# Altium footprint library ThanhNT.PcbLib: 579 footprints (part 17 of 37)
Each footprint in its own frame and in the unit in brackets; x right, y up, seen from the top. Pads: shape width x height; smd on the part's side, far side on the other; paste and mask are expansions set on the pad; w line width, h text height; cw(c..) or ccw(c..) is an arc to the next point about the centre after c.
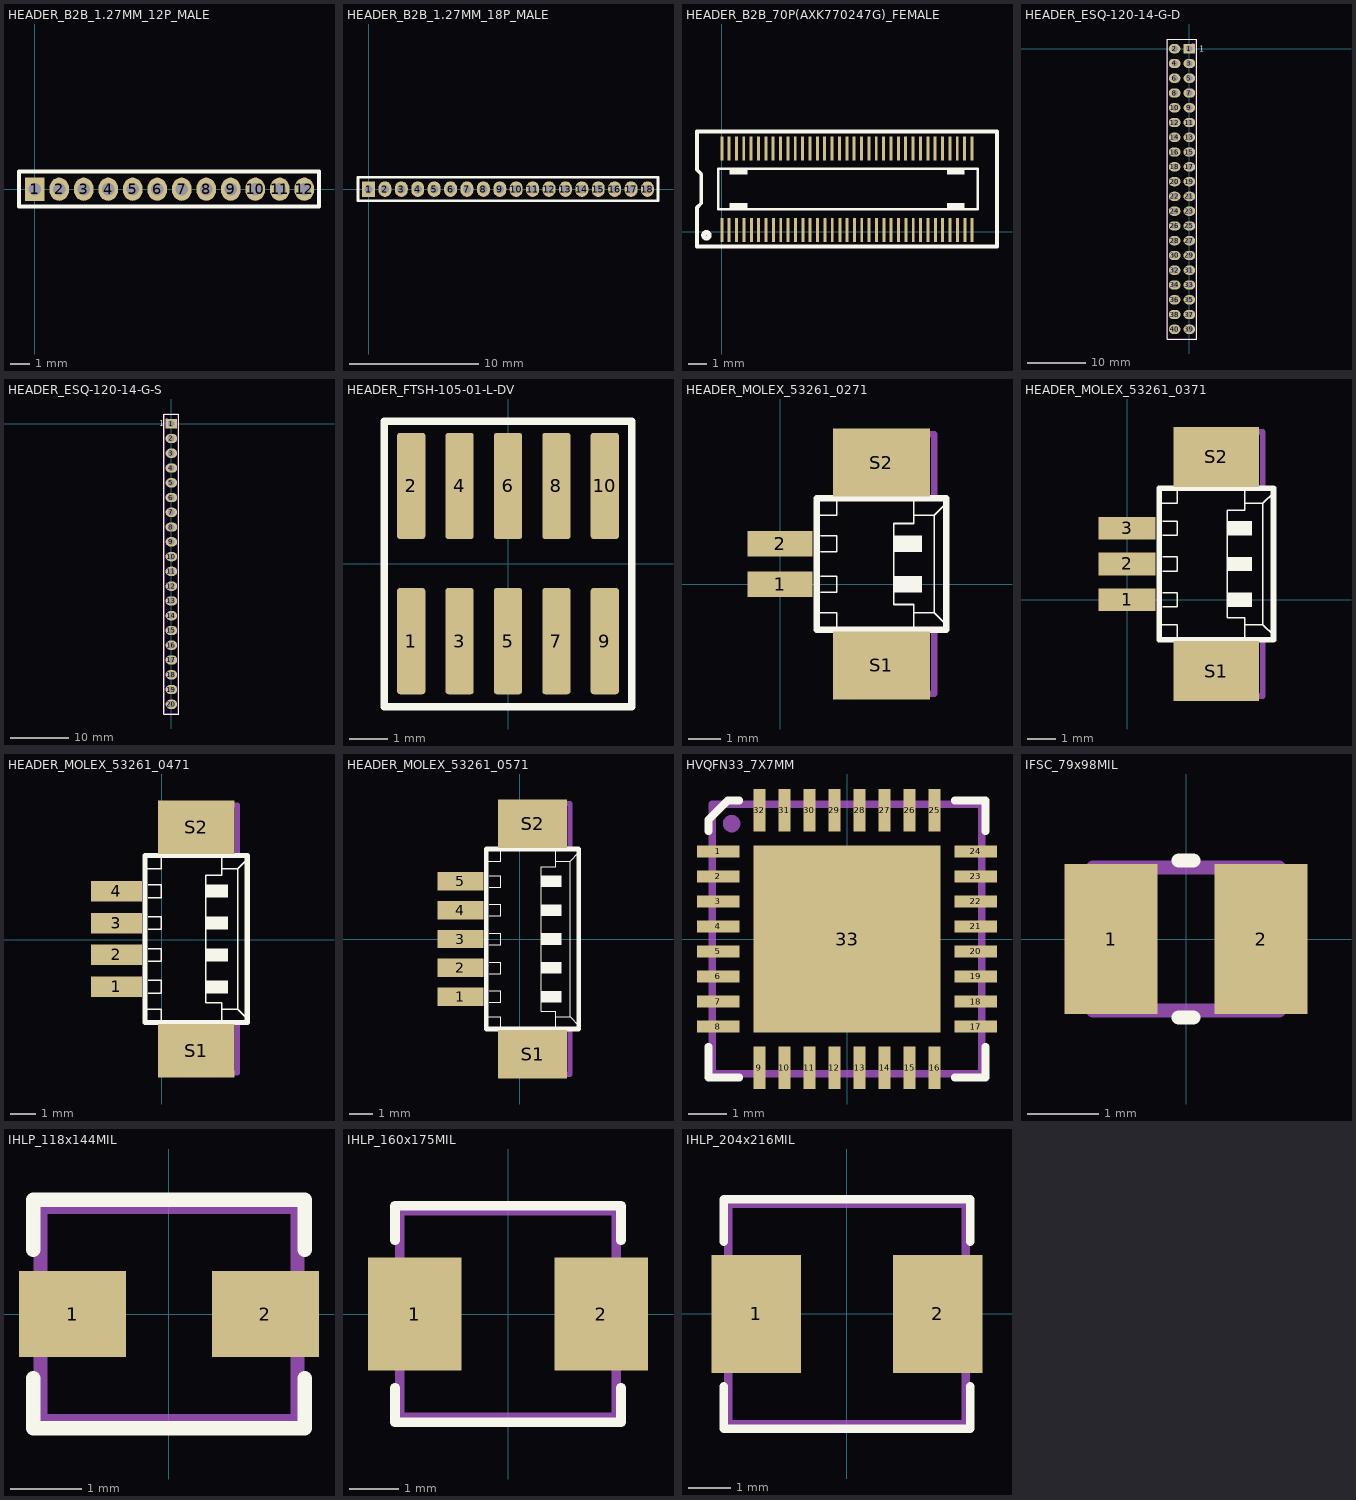
[diagram p16: the footprints below, top view; thin cyan lines are the x and y axes]

## HEADER_B2B_1.27MM_12P_MALE [mm]
pads (12):
  rect 1x1.2 hole 0.65: 1(0,0)
  oval 1x1.2 hole 0.65: 2(1.27,0) 3(2.54,0) 4(3.81,0) 5(5.08,0) 6(6.35,0) 7(7.62,0) 8(8.89,0) 9(10.16,0) 10(11.43,0) 11(12.7,0) 12(13.97,0)
Top Overlay:
  lines w0.2: -0.813,-0.889 14.732,-0.889 14.732,0.914 -0.813,0.914 -0.813,-0.889

## HEADER_B2B_1.27MM_18P_MALE [mm]
pads (18):
  rect 1x1.2 hole 0.65: 1(0,0)
  oval 1x1.2 hole 0.65: 2(1.27,0) 3(2.54,0) 4(3.81,0) 5(5.08,0) 6(6.35,0) 7(7.62,0) 8(8.89,0) 9(10.16,0) 10(11.43,0) 11(12.7,0) 12(13.97,0) 13(15.24,0) 14(16.51,0) 15(17.78,0) 16(19.05,0) 17(20.32,0) 18(21.59,0)
Top Overlay:
  lines w0.2: -0.813,-0.889 -0.813,0.914 22.403,0.914 22.403,-0.889 -0.813,-0.889

## HEADER_B2B_70P(AXK770247G)_FEMALE [mm] "Board to Board Connector (AXK770247G)"
pads (70):
  rect 0.16x1.3 smd: 1(0,0.076) 2(0.4,0.076) 3(0.8,0.076) 4(1.2,0.076) 5(1.6,0.076) 6(2,0.076) 7(2.4,0.076) 8(2.8,0.076) 9(3.2,0.076) 10(3.6,0.076) 11(4,0.076) 12(4.4,0.076) 13(4.8,0.076) 13(5.2,0.076) 15(5.6,0.076) 16(6,0.076) 17(6.42,0.086) 18(6.8,0.076) 19(7.2,0.076) 20(7.6,0.076) 21(8,0.076) 22(8.4,0.076) 23(8.8,0.076) 24(9.2,0.076) 25(9.6,0.076) 26(10,0.076) 27(10.4,0.076) 28(10.8,0.076) 29(11.2,0.076) 30(11.6,0.076) 31(12,0.076) 32(12.4,0.076) 33(12.8,0.076) 34(13.2,0.076) 35(13.6,0.076) 36(13.6,4.516) 37(13.189,4.516) 38(12.789,4.516) 39(12.389,4.516) 40(11.989,4.516) 41(11.589,4.516) 42(11.189,4.516) 43(10.789,4.516) 44(10.389,4.516) 45(9.989,4.516) 46(9.589,4.516) 47(9.189,4.516) 48(8.789,4.516) 49(8.389,4.516) 50(7.989,4.516) 51(7.589,4.516) 52(7.189,4.516) 53(6.789,4.516) 54(6.389,4.516) 55(5.989,4.516) 56(5.589,4.516) 57(5.189,4.516) 58(4.789,4.516) 59(4.389,4.516) 60(3.989,4.516) 61(3.589,4.516) 62(3.189,4.516) 63(2.789,4.516) 64(2.389,4.516) 65(1.989,4.516) 66(1.589,4.516) 67(1.189,4.516) 68(0.789,4.516) 69(0.389,4.516) 70(0,4.516)
Top Overlay:
  circle w0.254: c-0.838,-0.203 r0.156
  rectangle: 0.42,3.096 1.39,3.406
  rectangle: 0.42,1.246 1.39,1.556
  rectangle: 12.22,3.096 13.19,3.406
  rectangle: 12.22,1.246 13.19,1.556
  lines w0.127: -0.2,1.206 13.9,1.206 13.9,3.416 -0.2,3.416 -0.2,1.206
  lines w0.2: -1.35,-0.813 -1.35,1.301 -1.12,1.531 -1.12,3.121 -1.35,3.351 -1.35,5.436 14.95,5.436 14.95,-0.813 -1.35,-0.813
3D body "axk770247.stp": height 1.92, standoff 0, extent -1.343,-0.239 14.957,4.861

## HEADER_ESQ-120-14-G-D [mm]
pads (40):
  rect 2x1.6 hole 1.1: 1(0,0)
  oval 2x1.6 hole 1.1: 2(-2.54,0) 3(0,-2.54) 4(-2.54,-2.54) 5(0,-5.08) 6(-2.54,-5.08) 7(0,-7.62) 8(-2.54,-7.62) 9(0,-10.16) 10(-2.54,-10.16) 11(0,-12.7) 12(-2.54,-12.7) 13(0,-15.24) 14(-2.54,-15.24) 15(0,-17.78) 16(-2.54,-17.78) 17(0,-20.32) 18(-2.54,-20.32) 19(0,-22.86) 20(-2.54,-22.86) 21(0,-25.4) 22(-2.54,-25.4) 23(0,-27.94) 24(-2.54,-27.94) 25(0,-30.48) 26(-2.54,-30.48) 27(0,-33.02) 28(-2.54,-33.02) 29(0,-35.56) 30(-2.54,-35.56) 31(0,-38.1) 32(-2.54,-38.1) 33(0,-40.64) 34(-2.54,-40.64) 35(0,-43.18) 36(-2.54,-43.18) 37(0,-45.72) 38(-2.54,-45.72) 39(0,-48.26) 40(-2.54,-48.26)
Top Overlay:
  lines w0.2: -3.84,-49.93 -3.84,1.67 1.3,1.67 1.3,-49.93 -3.84,-49.93
  text "1" at 1.65,-0.5 h1.02
Bottom Overlay:
  lines w0.2: -3.84,-49.93 1.3,-49.93 1.3,1.67 -3.84,1.67 -3.84,-49.93
  text "1" at 2,-0.41 h1.02
Mechanical 16:
  circle w0.5: c0.6,0.6 r0.1
  lines w0.2: -3.74,-49.85 1.2,-49.85 1.2,1.59 -3.74,1.59 -3.74,-49.85
Mechanical 29:
  text ".Designator" at -0.6,-25.6 h1.52
3D body "ESQ-120-14-G-D.stp": height 12.11, standoff -11.13, extent -3.81,-49.784 1.27,1.524

## HEADER_ESQ-120-14-G-S [mm]
pads (20):
  rect 2x1.6 hole 1.1: 1(0,0)
  oval 2x1.6 hole 1.1: 2(0,-2.54) 3(0,-5.08) 4(0,-7.62) 5(0,-10.16) 6(0,-12.7) 7(0,-15.24) 8(0,-17.78) 9(0,-20.32) 10(0,-22.86) 11(0,-25.4) 12(0,-27.94) 13(0,-30.48) 14(0,-33.02) 15(0,-35.56) 16(0,-38.1) 17(0,-40.64) 18(0,-43.18) 19(0,-45.72) 20(0,-48.26)
Top Overlay:
  lines w0.2: -1.3,-49.93 -1.3,1.67 1.3,1.67 1.3,-49.93 -1.3,-49.93
  text "1" at -2.12,-0.4 h1.02
Bottom Overlay:
  lines w0.2: -1.3,-49.93 1.3,-49.93 1.3,1.67 -1.3,1.67 -1.3,-49.93
  text "1" at -0.82,2.2 h1.02
Mechanical 16:
  circle w0.254: c-0.8,0.79 r0.1
  lines w0.254: -1.2,-49.85 -1.2,1.59 1.2,1.59 1.2,-49.85 -1.2,-49.85
Mechanical 29:
  text ".Designator" at 0.78,-25.4 h1.52
3D body "ESQ-120-14-G-S.stp": height 11.11, standoff -12.13, extent -1.274,-49.784 1.266,1.524

## HEADER_FTSH-105-01-L-DV [mm] "FTSH-105-01-L-DV"
height 6
pads (10):
  rrect20% 0.74x2.79 smd: 1(-2.54,-2.035) 2(-2.54,2.035) 3(-1.27,-2.035) 4(-1.27,2.035) 5(0,-2.035) 6(0,2.035) 7(1.27,-2.035) 8(1.27,2.035) 9(2.54,-2.035) 10(2.54,2.035)
Top Overlay:
  lines w0.2: -3.251,-3.759 -3.251,3.734 3.251,3.734 3.251,-3.759 -3.251,-3.759
3D body "FTSH-105-01-L-DV.step": height 6.01, standoff 0.04, extent -3.175,-2.921 3.175,2.921

## HEADER_MOLEX_10P (NOTOK) [mm]
3D body "SW3dPS-Molex - 15-91-0100 (Pin Header 2.54mm 10 Pin).STEP": height 3.5, standoff -3.5, extent 46.279,64.559 58.979,74.219

## HEADER_MOLEX_53261_0271 [mm]
pads (4):
  rect 2x0.8 smd: 1(0,0) 2(0,1.25)
  rect 3x2.1 smd: S1(3.125,-2.5) S2(3.125,3.75)
Top Overlay:
  region: 3.5,0.25 3.5,-0.25 4.375,-0.25 4.375,0.25
  region: 3.5,1.5 3.5,1 4.375,1 4.375,1.5
  lines w0.051: 1.125,-0.875 1.75,-0.875 1.75,-1.375 ; 1.125,2.125 1.75,2.125 1.75,2.625 ; 1.25,-0.25 1.75,-0.25 1.75,0.25 1.25,0.25 ; 1.25,1 1.75,1 1.75,1.5 1.25,1.5 ; 4.125,-1.375 4.125,-0.875 ; 4.125,2.625 4.125,2.125 ; 5.125,-1.25 4.75,-0.875 ; 5.125,2.5 4.75,2.125 ; 4.125,-0.875 4.75,-0.875 ; 4.125,-0.875 4.125,-0.625 3.5,-0.625 3.5,1.875 4.125,1.875 4.125,2.125 ; 4.125,2.125 4.75,2.125 ; 4.75,-0.875 4.75,2.125
  lines w0.203: 1.125,-1.4 5.125,-1.4 5.125,-1.25 5.125,2.5 5.125,2.65 1.125,2.65 1.125,2.125 1.125,-0.875 1.125,-1.4
Mechanical 16:
  lines w0.203: 1.75,-1.5 1.75,-3.375 4.75,-3.375 4.75,-1.5 ; 1.75,2.75 1.75,4.625 4.75,4.625 4.75,2.75
  text "1" at 2.25,-1.875 h2.99
3D body "User Library-molex 5326153261-0271.STEP": height 3.5, standoff 0, extent -0.152,-3.228 5.048,4.422

## HEADER_MOLEX_53261_0371 [mm]
pads (5):
  rect 2x0.8 smd: 1(0,0) 2(0,1.25) 3(0,2.5)
  rect 3x2.1 smd: S1(3.125,-2.5) S2(3.125,5)
Top Overlay:
  region: 3.5,2.75 3.5,2.25 4.375,2.25 4.375,2.75
  region: 3.5,1.5 3.5,1 4.375,1 4.375,1.5
  region: 3.5,0.25 3.5,-0.25 4.375,-0.25 4.375,0.25
  lines w0.051: 1.125,-0.875 1.75,-0.875 1.75,-1.375 ; 1.125,3.375 1.75,3.375 1.75,3.875 ; 1.25,-0.25 1.75,-0.25 1.75,0.25 1.25,0.25 ; 1.25,1 1.75,1 1.75,1.5 1.25,1.5 ; 1.25,2.25 1.75,2.25 1.75,2.75 1.25,2.75 ; 4.125,-1.375 4.125,-0.875 ; 4.125,3.875 4.125,3.375 ; 5.125,-1.25 4.75,-0.875 ; 5.125,3.75 4.75,3.375 ; 4.125,-0.875 4.125,-0.625 3.5,-0.625 3.5,3.125 4.125,3.125 4.125,3.375 ; 4.125,-0.875 4.75,-0.875 ; 4.125,3.375 4.75,3.375 ; 4.75,-0.875 4.75,3.375
  lines w0.203: 1.125,-1.4 1.125,-0.875 1.125,3.375 1.125,3.9 5.125,3.9 5.125,3.75 5.125,-1.25 5.125,-1.4 1.125,-1.4
Mechanical 16:
  lines w0.203: 1.75,-1.5 1.75,-3.375 4.75,-3.375 4.75,-1.5 ; 1.75,4 1.75,5.875 4.75,5.875 4.75,4
  text "1" at 2.25,-1.875 h2.99
3D body "User Library-molex 5326153261-0371.STEP": height 3.5, standoff 0, extent -0.086,-3.205 5.114,5.695

## HEADER_MOLEX_53261_0471 [mm]
pads (6):
  rect 2x0.8 smd: 1(-1.782,-1.844) 2(-1.782,-0.594) 3(-1.782,0.656) 4(-1.782,1.906)
  rect 3x2.1 smd: S1(1.343,-4.344) S2(1.343,4.406)
Top Overlay:
  region: 1.718,-1.594 1.718,-2.094 2.593,-2.094 2.593,-1.594
  region: 1.718,-0.344 1.718,-0.844 2.593,-0.844 2.593,-0.344
  region: 1.718,0.906 1.718,0.406 2.593,0.406 2.593,0.906
  region: 1.718,2.156 1.718,1.656 2.593,1.656 2.593,2.156
  lines w0.051: -0.657,-2.719 -0.032,-2.719 -0.032,-3.219 ; -0.657,2.781 -0.032,2.781 -0.032,3.281 ; -0.532,-2.094 -0.032,-2.094 -0.032,-1.594 -0.532,-1.594 ; -0.532,-0.844 -0.032,-0.844 -0.032,-0.344 -0.532,-0.344 ; -0.532,0.406 -0.032,0.406 -0.032,0.906 -0.532,0.906 ; -0.532,1.656 -0.032,1.656 -0.032,2.156 -0.532,2.156 ; 2.343,-3.219 2.343,-2.719 ; 2.343,3.281 2.343,2.781 ; 3.343,-3.094 2.968,-2.719 ; 3.343,3.156 2.968,2.781 ; 2.343,-2.719 2.968,-2.719 ; 2.343,-2.719 2.343,-2.469 1.718,-2.469 1.718,2.531 2.343,2.531 2.343,2.781 ; 2.343,2.781 2.968,2.781 ; 2.968,-2.719 2.968,2.781
  lines w0.203: -0.657,-3.244 3.343,-3.244 3.343,-3.094 3.343,3.156 3.343,3.306 -0.657,3.306 -0.657,2.781 -0.657,-2.719 -0.657,-3.244
Mechanical 16:
  lines w0.203: -0.032,-3.344 -0.032,-5.219 2.968,-5.219 2.968,-3.344 ; -0.032,3.406 -0.032,5.281 2.968,5.281 2.968,3.406
  text "1" at 0.468,-3.719 h2.99
3D body "User Library-molex 5326153261-0471.STEP": height 3.5, standoff 0, extent -1.916,-5.064 3.284,5.086

## HEADER_MOLEX_53261_0571 [mm]
pads (7):
  rect 2x0.8 smd: 1(-2.564,-2.491) 2(-2.564,-1.24) 3(-2.564,0.01) 4(-2.564,1.26) 5(-2.564,2.51)
  rect 3x2.1 smd: S1(0.561,-4.99) S2(0.561,5.01)
Top Overlay:
  region: 0.936,2.76 0.936,2.26 1.811,2.26 1.811,2.76
  region: 0.936,1.51 0.936,1.01 1.811,1.01 1.811,1.51
  region: 0.936,0.26 0.936,-0.24 1.811,-0.24 1.811,0.26
  region: 0.936,-0.99 0.936,-1.491 1.811,-1.491 1.811,-0.99
  region: 0.936,-2.24 0.936,-2.74 1.811,-2.74 1.811,-2.24
  lines w0.051: -1.439,-3.365 -0.814,-3.365 -0.814,-3.865 ; -1.439,3.385 -0.814,3.385 -0.814,3.885 ; -1.314,-2.74 -0.814,-2.74 -0.814,-2.24 -1.314,-2.24 ; -1.314,-1.491 -0.814,-1.491 -0.814,-0.99 -1.314,-0.99 ; -1.314,-0.24 -0.814,-0.24 -0.814,0.26 -1.314,0.26 ; -1.314,1.01 -0.814,1.01 -0.814,1.51 -1.314,1.51 ; -1.314,2.26 -0.814,2.26 -0.814,2.76 -1.314,2.76 ; 1.561,-3.865 1.561,-3.365 ; 1.561,3.885 1.561,3.385 ; 2.561,-3.74 2.186,-3.365 ; 2.561,3.76 2.186,3.385 ; 1.561,-3.365 1.561,-3.115 0.936,-3.115 0.936,3.135 1.561,3.135 1.561,3.385 ; 1.561,-3.365 2.186,-3.365 ; 1.561,3.385 2.186,3.385 ; 2.186,-3.365 2.186,3.385
  lines w0.203: -1.439,-3.89 -1.439,-3.365 -1.439,3.385 -1.439,3.91 2.561,3.91 2.561,3.76 2.561,-3.74 2.561,-3.89 -1.439,-3.89
Mechanical 16:
  lines w0.203: -0.814,-3.99 -0.814,-5.865 2.186,-5.865 2.186,-3.99 ; -0.814,4.01 -0.814,5.885 2.186,5.885 2.186,4.01
  text "1" at -0.314,-4.365 h2.99
3D body "User Library-molex 5326153261-0571.STEP": height 3.5, standoff 0, extent -2.765,-5.69 2.435,5.71

## HVQFN33_7X7MM [mm]
pads (33):
  rect 1.1x0.3 smd mask+0.06: 1(-3.35,2.275) 2(-3.35,1.625) 3(-3.35,0.975) 4(-3.35,0.325) 5(-3.35,-0.325) 6(-3.35,-0.975) 7(-3.35,-1.625) 8(-3.35,-2.275) 17(3.35,-2.275) 18(3.35,-1.625) 19(3.35,-0.975) 20(3.35,-0.325) 21(3.35,0.325) 22(3.35,0.975) 23(3.35,1.625) 24(3.35,2.275)
  rect 0.3x1.1 smd mask+0.06: 9(-2.275,-3.35) 10(-1.625,-3.35) 11(-0.975,-3.35) 12(-0.325,-3.35) 13(0.325,-3.35) 14(0.975,-3.35) 15(1.625,-3.35) 16(2.275,-3.35) 25(2.275,3.35) 26(1.625,3.35) 27(0.975,3.35) 28(0.325,3.35) 29(-0.325,3.35) 30(-0.975,3.35) 31(-1.625,3.35) 32(-2.275,3.35)
  rect 4.85x4.85 smd paste-10 mask+0.06: 33(0,0)
Top Overlay:
  lines w0.2: -3.6,-2.8 -3.6,-3.6 -2.8,-3.6 ; -3.6,2.8 -3.6,3.1 -3.1,3.6 -2.8,3.6 ; 2.8,-3.6 3.6,-3.6 3.6,-2.8 ; 2.8,3.6 3.6,3.6 3.6,2.8
Top Paste:
  rectangle: -2.2,0.2 -0.2,2.2
  region: -0.2,-2.2 -0.2,-0.2 -2.2,-0.2 -2.2,-2.2
  region: 2.2,-0.2 0.2,-0.2 0.2,-2.2 2.2,-2.2
  region: 0.2,2.2 0.2,0.2 2.2,0.2 2.2,2.2
Mechanical 16:
  circle w0.254: c-3,3 r0.1
  lines w0.2: -3.5,-3.5 3.5,-3.5 3.5,3.5 -3.5,3.5 -3.5,-3.5
3D body: height 1, standoff 0, extent -3.5,-3.5 3.5,3.5

## IFSC_79x98MIL [mm]
pads (2):
  rect 1.3x2.1 smd: 1(-1.05,0) 2(1.05,0)
Top Overlay:
  lines w0.2: -0.1,-1.1 0.1,-1.1 ; -0.1,1.1 0.1,1.1
Mechanical 16:
  lines w0.2: -1.3,-1 -1.3,1 1.3,1 1.3,-1 -1.3,-1
3D body: height 1.2, standoff 0, extent -1.3,-1 1.3,1

## IHLP_118x144MIL [mm]
pads (2):
  rect 1.5x1.2 smd: 1(-1.35,0) 2(1.35,0)
Top Overlay:
  lines w0.2: -1.9,-0.9 -1.9,-1.6 1.9,-1.6 1.9,-0.9 ; -1.9,0.9 -1.9,1.6 1.9,1.6 1.9,0.9
Mechanical 16:
  lines w0.2: -1.8,-1.5 -1.8,1.5 1.8,1.5 1.8,-1.5 -1.8,-1.5
3D body: height 1.5, standoff 0, extent -1.9,-1.5 1.9,1.5

## IHLP_160x175MIL [mm]
pads (2):
  rect 1.9x2.3 smd: 1(-1.9,0) 2(1.9,0)
Top Overlay:
  lines w0.2: -2.3,-1.5 -2.3,-2.2 2.3,-2.2 2.3,-1.5 ; -2.3,1.5 -2.3,2.2 2.3,2.2 2.3,1.5
Mechanical 16:
  lines w0.2: -2.2,-2.1 -2.2,2.1 2.2,2.1 2.2,-2.1 -2.2,-2.1
3D body: height 1.2, standoff 0, extent -2.3,-2.1 2.3,2.1

## IHLP_204x216MIL [mm]
pads (2):
  rect 2.115x2.79 smd: 1(-2.137,0) 2(2.138,0)
Top Overlay:
  lines w0.2: -2.9,-1.7 -2.9,-2.7 2.9,-2.7 2.9,-1.7 ; -2.9,1.7 -2.9,2.7 2.9,2.7 2.9,1.7
Mechanical 16:
  lines w0.2: -2.8,-2.6 2.8,-2.6 2.8,2.6 -2.8,2.6 -2.8,-2.6
3D body: height 3, standoff 0, extent -2.75,-2.6 2.75,2.6